# Altium integrated library Cells_in_Space.IntLib: 57 symbols (continued)
## CMP-2002-08143-1
designator R?, comment CRCW040210R0FKED
Manufacturer: Vishay Dale; Manufacturer: Vishay; Part Number: CRCW040210R0FKED; Manufacturer Part Number: CRCW040210R0FKED
footprint RESC1005X40X25NL05T05 (Chip Resistor, 2-Leads, Body 1.00x0.50mm, IPC Medium Density)
footprint RESC1005X40X25LL05T05 (Chip Resistor, 2-Leads, Body 1.00x0.50mm, IPC High Density)
footprint RESC1005X40X25ML05T05 (Chip Resistor, 2-Leads, Body 1.00x0.50mm, IPC Low Density)
pins: 1, 2
1 alternate drawing of the same symbol

## CMP-2002-08148-1
designator R?, comment CRCW0402110KFKED
Manufacturer: Vishay Dale; Manufacturer: Vishay; Part Number: CRCW0402110KFKED; Manufacturer Part Number: CRCW0402110KFKED
footprint RESC1005X40X25NL05T05 (Chip Resistor, 2-Leads, Body 1.00x0.50mm, IPC Medium Density)
footprint RESC1005X40X25ML05T05 (Chip Resistor, 2-Leads, Body 1.00x0.50mm, IPC Low Density)
footprint RESC1005X40X25LL05T05 (Chip Resistor, 2-Leads, Body 1.00x0.50mm, IPC High Density)
pins: 1, 2
1 alternate drawing of the same symbol

## CMP-2002-08276-2
designator R?, comment CRCW04021K00FKED
RES Thick Film, 1kΩ, 1%, 0.063W, 100ppm/°C, 0402; Manufacturer: Vishay Dale; Resistance: 1kR; Power Rating: 63mW; Voltage Rating (DC): 50V; Package Quantity: 10; Termination: SMD/SMT; Width: 0.5mm; Military Standard: Not; Length: 1mm; Contact Plating: Tin; Mount: Surface Mount; Packaging: Tape and Reel; Case Code (Imperial): 0402; Tolerance: 1%; Weight: 2.3E-05oz; Number of Pins: 2; Case/Package: 0402; Case Code (Metric): 1005; Lead Free: Lead Free; Number of Terminations: 2; Max Power Dissipation: 63mW; Depth: 0.5mm; Temperature Coefficient: 100ppm/°C; Max Operating Temperature: 155°C; Height: 0.35mm; Features: Automotive AEC-Q200; Composition: Thick Film; Radiation Hardening: No; Voltage Rating: 50V; Min Operating Temperature: -55°C; Manufacturer Part Number: CRCW04021K00FKED
footprint FP-CRCW0402-e3-MFG
footprint FP-CRCW0402-e3-IPC_C
footprint FP-CRCW0402-e3-IPC_B
footprint FP-CRCW0402-e3-IPC_A
pins: 1, 2

## CMP-2002-08403-1
designator R?, comment CRCW040224K0FKED
Manufacturer: Vishay Dale; Manufacturer: Vishay; Part Number: CRCW040224K0FKED; Manufacturer Part Number: CRCW040224K0FKED
footprint RESC1005X40X25ML05T05 (Chip Resistor, 2-Leads, Body 1.00x0.50mm, IPC Low Density)
footprint RESC1005X40X25LL05T05 (Chip Resistor, 2-Leads, Body 1.00x0.50mm, IPC High Density)
footprint RESC1005X40X25NL05T05 (Chip Resistor, 2-Leads, Body 1.00x0.50mm, IPC Medium Density)
pins: 1, 2
1 alternate drawing of the same symbol

## CMP-2002-08466-2
designator R?, comment CRCW04022K70FKED
RES Thick Film, 2.7kΩ, 1%, 0.063W, 100ppm/°C, 0402; Manufacturer: Vishay; Power Rating: 63mW; Voltage Rating (DC): 50V; Resistance: 2.7kR; Termination: SMD/SMT; Composition: Thick Film; Packaging: Tape and Reel; Tolerance: 1%; Number of Pins: 2; Contact Plating: Tin; Max Operating Temperature: 155°C; Depth: 0.5mm; Features: Automotive AEC-Q200; Lead Free: Lead Free; Number of Terminations: 2; Case/Package: 0402; Max Power Dissipation: 63mW; Radiation Hardening: No; Height: 0.35mm; Min Operating Temperature: -55°C; Width: 0.02inch; Military Standard: Not; Package Quantity: 10; Weight: 2.3E-05oz; Temperature Coefficient: 100ppm/°C; Case Code (Metric): 1005; Voltage Rating: 50V; Length: 1mm; Case Code (Imperial): 0402; Manufacturer Part Number: CRCW04022K70FKED
footprint FP-CRCW0402-e3-IPC_A
footprint FP-CRCW0402-e3-IPC_C
footprint FP-CRCW0402-e3-IPC_B
footprint FP-CRCW0402-e3-MFG
pins: 1, 2

## CMP-2002-08529-2
designator R?, comment CRCW040233K2FKED
NexarPartId: 39869749; Manufacturer: Vishay; Power Rating: 63mW; Temperature Coefficient: 100ppm/°C; Resistance: 33.2kΩ; Voltage Rating: 50V; Tolerance: 1%; REACH SVHC: Unknown; Number of Pins: 2; Military Standard: Not; Composition: Thick Film; Case Code (Imperial): 0402; Number of Terminations: 2; Lead Free: Lead Free; Case Code (Metric): 1005; Termination: SMD/SMT; Case/Package: 0402; Contact Plating: Tin; Height: 350µm; Min Operating Temperature: -55°C; Mount: Surface Mount; Max Operating Temperature: 155°C; Features: Automotive AEC-Q200; Length: 1mm; Weight: 652.039032µg; Packaging: Cut Tape; Schedule B: 8533210045, 8533210045; Voltage Rating (DC): 50V; Depth: 500µm; Max Power Dissipation: 63mW; RoHS: Compliant; Radiation Hardening: No; Width: 500µm; Manufacturer Part Number: CRCW040233K2FKED
footprint Vishay_CRCW0402-e3_MFG (SMD Chip Resistor, 33.2 kOhm, ± 1%, 63 mW, 0402 [1005 Metric], Thick Film, General Purpose)
footprint Vishay_CRCW0402-e3_IPC_A (SMD Chip Resistor, 33.2 kOhm, ± 1%, 63 mW, 0402 [1005 Metric], Thick Film, General Purpose)
footprint Vishay_CRCW0402-e3_IPC_B (SMD Chip Resistor, 33.2 kOhm, ± 1%, 63 mW, 0402 [1005 Metric], Thick Film, General Purpose)
footprint Vishay_CRCW0402-e3_IPC_C (SMD Chip Resistor, 33.2 kOhm, ± 1%, 63 mW, 0402 [1005 Metric], Thick Film, General Purpose)
pins: 1, 2

## CMP-2006-02363-4
designator C?, comment GCM188R71E105KA64D
Manufacturer Lifecycle Status: IN PRODUCTION; NexarPartId: 18909256; Manufacturer: Murata; Dielectric: X7R; Material: Ceramic; Tolerance: 10%; Capacitance: 1µF; Voltage Rating: 25V; Thickness: 889µm; Max Operating Temperature: 125°C; Radiation Hardening: No; Weight: 6.293594mg; Lead Free: Lead Free; Mount: Surface Mount; Case Code (Imperial): 0603; REACH SVHC: No SVHC; Lifecycle Status: Production; Depth: 800µm; Min Operating Temperature: -55°C; Height: 800µm; Case Code (Metric): 1608; Case/Package: 0603; Voltage: 25V; Packaging: Cut Tape; Length: 1.6mm; Termination: SMD/SMT; Width: 787.4µm; Voltage Rating (DC): 25V; RoHS: Compliant; Schedule B: 8532240020, 8532240020; Ratings: AEC-Q200; Manufacturer Part Number: GCM188R71E105KA64D
footprint FP-GCM188-0_1-MFG (Multilayer Ceramic Capacitor, 1 uF, 25 V, ± 10%, X7R, 0603 [1608 Metric])
footprint FP-GCM188-0_1-IPC_A (Multilayer Ceramic Capacitor, 1 uF, 25 V, ± 10%, X7R, 0603 [1608 Metric])
footprint FP-GCM188-0_1-IPC_B (Multilayer Ceramic Capacitor, 1 uF, 25 V, ± 10%, X7R, 0603 [1608 Metric])
footprint FP-GCM188-0_1-IPC_C (Multilayer Ceramic Capacitor, 1 uF, 25 V, ± 10%, X7R, 0603 [1608 Metric])
pins: 1, 2

## CMP-2008-03711-3
designator C?, comment GCM155R71C104KA55D
Ceramic Capacitor for Automotive 100nF ±10% 16VDC X7R 0402 Paper T/R; Manufacturer: Murata; Voltage Rating (DC): 16V; Termination: SMD/SMT; Length: 1mm; Voltage: 16V; Mount: Surface Mount; Packaging: Tape and Reel; Case Code (Metric): 1005; Case/Package: 0402; Voltage Rating: 16V; Min Operating Temperature: -55°C; Case Code (Imperial): 0402; Ratings: AEC-Q200; Height: 0.5mm; Tolerance: 10%; Width: 0.02inch; Radiation Hardening: No; Depth: 0.5mm; Capacitance: 100nF; Max Operating Temperature: 125°C; Package Quantity: 1; REACH SVHC: No SVHC; Thickness: 0.022inch; Dielectric: X7R; Lead Free: Lead Free; Manufacturer Part Number: GCM155R71C104KA55D
footprint FP-GCM155-0_05-IPC_C
footprint FP-GCM155-0_05-IPC_B
footprint FP-GCM155-0_05-IPC_A
footprint FP-GCM155-0_05-MFG
pins: 1, 2

## CMP-02407-012085-1
designator R?, comment CRCW040210K0FKEDC
RES 10K OHM 1% 1/16W 0402; Manufacturer: Vishay; Temperature Coefficient: 100ppm/°C; Power Rating: 62.5mW; Resistance: 10kR; Lead Free: Lead Free; Max Operating Temperature: 155°C; RoHS Compliant: Yes; Mount: Surface Mount; Min Operating Temperature: -55°C; Termination: Wraparound; Length: 1mm; Resistor Type: Thick Film; Contact Plating: Tin; Tolerance: 1%; Case/Package: Molded; Manufacturer Part Number: CRCW040210K0FKEDC
footprint FP-CRCW0402-C-e3-IPC_C
footprint FP-CRCW0402-C-e3-IPC_B
footprint FP-CRCW0402-C-e3-IPC_A
footprint FP-CRCW0402-C-e3-MFG
pins: 1, 2

## CMP-02550-000257-1
designator Q?, comment SQ2364EES-T1_GE3
MOSFET N-CH 60V 2A SOT23-3; Manufacturer: Vishay; Manufacturer Part Number: SQ2364EES-T1_GE3
footprint FP-S-03946-MFG
footprint FP-S-03946-IPC_B
footprint FP-S-03946-IPC_C
footprint FP-S-03946-IPC_A
pins: 1 G, 2 S, 3 D

## CMP-02766-001448-1
designator SWD?, comment FTSH-107-01-F-DV-K
CONN HEADER SMD 14POS 1.27MM; Manufacturer: Samtec; Gender: Male; Connector Type: Male Pin; Number of Contacts: 14; Row Spacing: 0.05inch; Min Operating Temperature: -55°C; Package Quantity: 1; Lead Free: Lead Free; RoHS Compliant: Yes; Contact Material: Bronze; Contact Plating: Gold; Number of Rows: 2; Housing Material: Polymer; Contact Type: Male Pin; Series: FTSH; Max Operating Temperature: 125°C; Orientation: Straight; Number of Positions: 14; Pitch: 1.27mm; Housing Color: Black; Color: Black; Radiation Hardening: No; Length: 8.89mm; Termination: Solder; Packaging: Rail/Tube; Depth: 5.84mm; Mount: Surface Mount; Contact Mating Length: 0.12inch; Manufacturer Part Number: FTSH-107-01-F-DV-K
footprint FP-FTSH-107-01-F-DV-K-MFG
part A pins: 1, 3, 5, 7, 9, 11, 13
part B pins: 2, 4, 6, 8, 10, 12, 14

## CMP-03020-034681-1
designator C?, comment C1206C102KGRACTU
CAP CER 1000PF 2KV X7R 1206; Manufacturer: KEMET; Tolerance: 10%; Capacitance: 1nF; Dissipation Factor: 2.5%; Dielectric Material: Ceramic; Voltage Rating (DC): 2.5kV; Voltage: 2kV; REACH SVHC: No SVHC; Height: 1.6mm; Construction: Flat; Case/Package: 1206; Series: C; Mount: Surface Mount; RoHS Compliant: Yes; Package Quantity: 1; Length: 3.2mm; Width: 0.063inch; Voltage Rating: 2kV; Min Operating Temperature: -55°C; Case Code (Metric): 3216; Termination: SMD/SMT; Number of Pins: 2; Case Code (Imperial): 1206; Packaging: Tape and Reel; Dielectric: X7R; Thickness: 0.069inch; Depth: 1.6mm; Radiation Hardening: No; Max Operating Temperature: 125°C; Manufacturer Part Number: C1206C102KGRACTU
footprint FP-C1206C-EF-MFG
footprint FP-C1206C-EF-IPC_C
footprint FP-C1206C-EF-IPC_B
footprint FP-C1206C-EF-IPC_A
pins: 1, 2

## CMP-03913-77814862-1
designator L?, comment 74404043330A
74404043330A WE-LQS SMT Semi-Shielded Power Inductor; NexarPartId: 77814862; Manufacturer: Wurth Electronics; Current Rating: 880mA; Inductance Tolerance: 20%; Inductance: 33µH; DC Resistance (DCR): 316mΩ; Ambient Temperature Range High: 85°C; Min Operating Temperature: -40°C; Length: 4mm; Height: 2.5mm; RoHS: Compliant; Ambient Temperature Range Low: -40°C; Width: 4mm; Max Operating Temperature: 125°C; Manufacturer Part Number: 74404043330A
footprint WE-LQS_4025 (WE-LQS SMT Semi-Shielded Power Inductor)
pins: 1, 2

## CMP-04918-000451-1
designator U?, comment LMR36015FSCQRNXTQ1
IC REG BUCK ADJ 1.5A 12VQFN; Manufacturer: Texas Instruments; RoHS Compliant: Yes; Manufacturer Part Number: LMR36015FSCQRNXTQ1
footprint FP-RNX0012B-MFG
pins: 1 PGND (power), 2 VIN (power), 3 NC, 4 BOOT, 5 VCC (power), 6 AGND (power), 7 FB (in), 8 PG (oc), 9 EN (in), 10 VIN (power), 11 PGND (power), 12 SW

## CMP-06035-006656-1
designator C?, comment GCM155R71H332KA37J
Ceramic Capacitor for Automotive 3.3nF ±10% 50VDC X7R 0402 Paper T/R; Manufacturer: Murata; Voltage Rating (DC): 50V; Max Operating Temperature: 125°C; Termination: SMD/SMT; Depth: 0.5mm; Min Operating Temperature: -55°C; Voltage Rating: 50V; Length: 1mm; Radiation Hardening: No; Tolerance: 10%; Case Code (Imperial): 0402; Mount: Surface Mount; Package Quantity: 50000; Width: 0.5mm; Height: 0.5mm; Case Code (Metric): 1005; Capacitance: 3.3nF; Packaging: Tape and Reel; Case/Package: 0402; Dielectric: X7R; Manufacturer Part Number: GCM155R71H332KA37J
footprint FP-GCM155-0_05-MFG
footprint FP-GCM155-0_05-IPC_B
footprint FP-GCM155-0_05-IPC_C
footprint FP-GCM155-0_05-IPC_A
pins: 1, 2

## CMP-06035-016531-1
designator C?, comment GCM155R71C224KE02D
Ceramic Capacitor for Automotive 220nF ±10% 16VDC X7R 0402 Paper T/R; Manufacturer: Murata; Voltage Rating (DC): 16V; Thickness: 0.022inch; Length: 0.039inch; Dielectric: X7R; Packaging: Tape and Reel; Min Operating Temperature: -55°C; Case Code (Imperial): 0402; Tolerance: 10%; Lead Free: Lead Free; Max Operating Temperature: 125°C; Case/Package: 0402; Mount: Surface Mount; Case Code (Metric): 1005; Weight: 0.000212oz; Height: 0.5mm; Voltage Rating: 16V; Ratings: AEC-Q200; Package Quantity: 10000; Capacitance: 220nF; Termination: SMD/SMT; Width: 0.5mm; Manufacturer Part Number: GCM155R71C224KE02D
footprint FP-GCM155-0_05-MFG
footprint FP-GCM155-0_05-IPC_C
footprint FP-GCM155-0_05-IPC_B
footprint FP-GCM155-0_05-IPC_A
pins: 1, 2

## CMP-06035-017415-1
designator C?, comment GRT188C81C106ME13D
Multi-Layer Ceramic Capacitor 10uF 16V X6S ±20% 0603 Paper T/R; Manufacturer: Murata; Capacitance: 10uF; Case Code (Imperial): 0603; Voltage Rating: 16V; Case/Package: 0603; Width: 0.031inch; Min Operating Temperature: -55°C; Tolerance: 20%; Case Code (Metric): 1608; Mount: Surface Mount; Packaging: Tape and Reel; Length: 0.063inch; Max Operating Temperature: 105°C; Thickness: 0.035inch; Ratings: AEC-Q200; Manufacturer Part Number: GRT188C81C106ME13D
footprint FP-GRT188-0_2-MFG
footprint FP-GRT188-0_2-IPC_C
footprint FP-GRT188-0_2-IPC_B
footprint FP-GRT188-0_2-IPC_A
pins: 1, 2

## CMP-06035-026512-1
designator C?, comment GCM21BC7YA225KE02L
Ceramic Capacitor for Automotive 2.2uF ±10% 35VDC X7S 0805 Embossed T/R; Manufacturer: Murata; Voltage Rating: 35V; Capacitance: 2.2uF; Case Code (Metric): 2012; Max Operating Temperature: 125°C; Min Operating Temperature: -55°C; Case Code (Imperial): 0805; Ratings: AEC-Q200; Packaging: Cut Tape; Mount: Surface Mount; Tolerance: 10%; Case/Package: 0805; Manufacturer Part Number: GCM21BC7YA225KE02L
footprint FP-GCM21B-0_15-MFG
footprint FP-GCM21B-0_15-IPC_B
footprint FP-GCM21B-0_15-IPC_C
footprint FP-GCM21B-0_15-IPC_A
pins: 1, 2

## CMP-06035-049372-1
designator C?, comment GCM21BC71E475KE36L
Ceramic Capacitor for Automotive 4.7uF ±10% 25VDC X7S 0805 Embossed T/R; Manufacturer: Murata; Voltage Rating: 25V; Mount: Surface Mount; Case/Package: 0805; Case Code (Imperial): 0805; Tolerance: 10%; Max Operating Temperature: 125°C; Capacitance: 4.7uF; Packaging: Cut Tape; Min Operating Temperature: -55°C; Ratings: AEC-Q200; Case Code (Metric): 2012; Manufacturer Part Number: GCM21BC71E475KE36L
footprint FP-GCM21B-0_2-e0_2_0_7-IPC_C
footprint FP-GCM21B-0_2-e0_2_0_7-MFG
footprint FP-GCM21B-0_2-e0_2_0_7-IPC_A
footprint FP-GCM21B-0_2-e0_2_0_7-IPC_B
pins: 1, 2

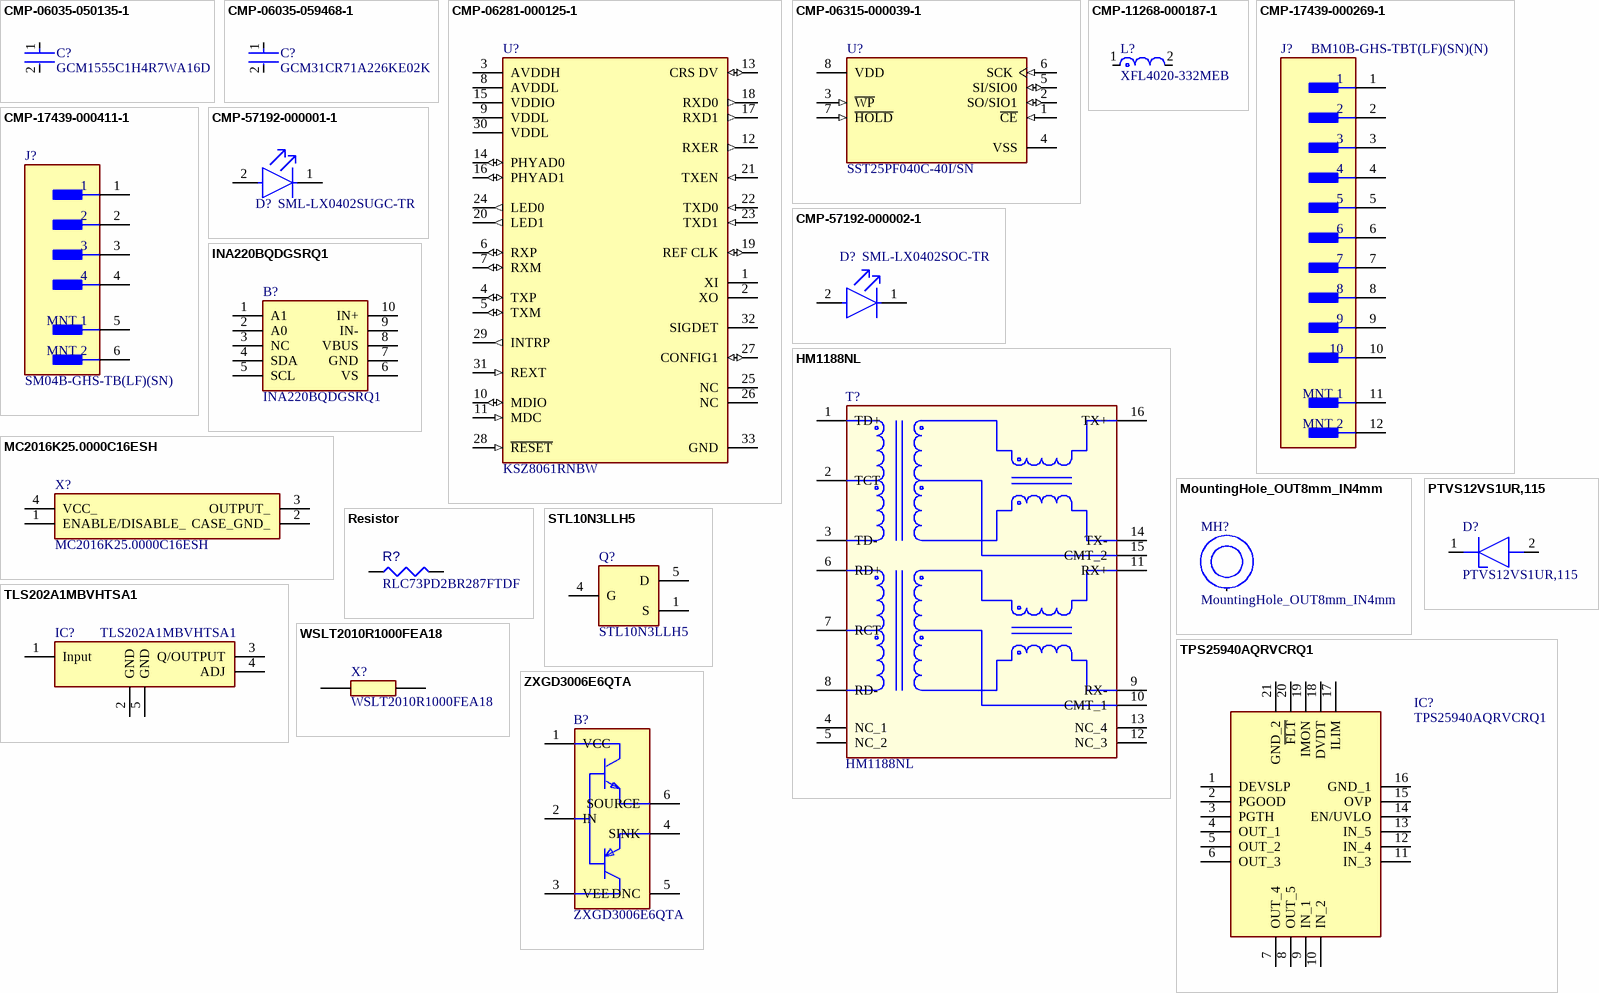
[diagram p1: symbols CMP-06035-050135-1 to ZXGD3006E6QTA]

## CMP-06035-050135-1
designator C?, comment GCM1555C1H4R7WA16D
Ceramic Capacitor for Automotive 4.7pF ±0.05pF 50VDC C0G 0402 Paper T/R; Manufacturer: Murata; Manufacturer Part Number: GCM1555C1H4R7WA16D
footprint FP-GCM155-0_05-MFG
footprint FP-GCM155-0_05-IPC_A
footprint FP-GCM155-0_05-IPC_B
footprint FP-GCM155-0_05-IPC_C
pins: 1, 2

## CMP-06035-059468-1
designator C?, comment GCM31CR71A226KE02K
Ceramic Capacitor for Automotive 22uF ±10% 10VDC X7R 1206 Embossed T/R; Manufacturer: Murata; Manufacturer Part Number: GCM31CR71A226KE02K
footprint FP-GCM31C-0_2-e0_3_0_8-IPC_A
footprint FP-GCM31C-0_2-e0_3_0_8-MFG
footprint FP-GCM31C-0_2-e0_3_0_8-IPC_C
footprint FP-GCM31C-0_2-e0_3_0_8-IPC_B
pins: 1, 2

## CMP-06281-000125-1
designator U?, comment KSZ8061RNBW
IC TRANSCEIVER FULL 1/1 32QFN; Manufacturer: Microchip; Data Rate: 100Mbps; Min Supply Voltage: 1.14V; Simplex/Duplex: Full Duplex; Max Supply Voltage: 3.465V; Packaging: Tray; Mount: Surface Mount; Case/Package: QFN; Max Operating Temperature: 105°C; Number of Pins: 32; Series: -; RoHS Compliant: No; REACH SVHC: No SVHC; Min Operating Temperature: -40°C; Manufacturer Part Number: KSZ8061RNBW
footprint FP-QFN55-32LD-PL-5-IPC_A
footprint FP-QFN55-32LD-PL-5-IPC_C
footprint FP-QFN55-32LD-PL-5-IPC_B
footprint FP-QFN55-32LD-PL-5-MFG
pins: 1 XI, 2 XO, 3 AVDDH (power), 4 TXP (io), 5 TXM (io), 6 RXP (io), 7 RXM (io), 8 AVDDL (power), 9 VDDL (power), 10 MDIO (io), 11 MDC (in), 12 RXER (out), 13 CRS DV (io), 14 PHYAD0 (io), 15 VDDIO (power), 16 PHYAD1 (io), 17 RXD1 (out), 18 RXD0 (out), 19 REF CLK (io), 20 LED1 (out), 21 TXEN (in), 22 TXD0 (in), 23 TXD1 (in), 24 LED0 (out), 25 NC, 26 NC, 27 CONFIG1 (io), 28 ~{RESET} (in), 29 INTRP (out), 30 VDDL (power), 31 REXT (in), 32 SIGDET, 33 GND (power)

## CMP-06315-000039-1
designator U?, comment SST25PF040C-40I/SN
IC FLASH 4MBIT SPI 40MHZ 8SOIC; Manufacturer: Microchip; Frequency: 40MHz; Min Operating Temperature: -40°C; Case/Package: SOIC; Max Operating Temperature: 85°C; Series: SST25; Packaging: Rail/Tube; Memory Type: FLASH; Interface: SPI; Manufacturer Part Number: SST25PF040C-40I/SN
footprint FP-C04-057-SN-IPC_B
footprint FP-C04-057-SN-IPC_A
footprint FP-C04-057-SN-IPC_C
footprint FP-C04-057-SN-MFG
pins: 1 ~{CE} (in), 2 SO/SIO1 (io), 3 ~{WP} (in), 4 VSS (power), 5 SI/SIO0 (io), 6 SCK (in), 7 ~{HOLD} (in), 8 VDD (power)

## CMP-11268-000187-1
designator L?, comment XFL4020-332MEB
Fixed Inductors 3.3Uh Shld 5.2A 38.3mOhms AECQ2; Manufacturer: Coilcraft; DC Resistance (DCR): 38.3mR; Shielding: Shielded; Inductance Tolerance: 20%; Saturation Current: 2.7A; Self Resonant Frequency: 33MHz; Test Frequency: 100kHz; Core Material: Composite; Series: XFL4020; Max Operating Temperature: 125°C; Mount: Surface Mount; Lead Free: Contains Lead; Height: 2.1mm; RMS Current (Irms): 5.2A; Termination: SMD/SMT; REACH SVHC: No SVHC; Tolerance: 20%; Package Quantity: 25; Length: 4.3mm; RoHS Compliant: Yes; Inductance: 3.3uH; Packaging: Tape and Reel; Case/Package: SMD/SMT; Width: 4.3mm; Max DC Current: 5.2A; Min Operating Temperature: -40°C; Manufacturer Part Number: XFL4020-332MEB
footprint FP-XFL4020-MFG
pins: 1, 2

## CMP-17439-000269-1
designator J?, comment BM10B-GHS-TBT(LF)(SN)(N)
CONN HEADER SMD 10POS 1.25MM; Manufacturer: JST; Mated Stacking Heights: 7.3mm; Number of Positions: 10; Voltage Rating: 50V; Packaging: Cut Tape; Contact Shape: Rectangular; Insulation Material: Nylon; Contact Type: Outer Shroud Contact; Contact Finish - Mating: TIN; Fastening Type: Ramp; Termination: Solder; Max Operating Temperature: 85°C; Min Operating Temperature: -25°C; Insulation Color: Natural; Number of Rows: 1; Flammability Rating: UL94 V-0; Contact Material: Bronze; Mount: Surface Mount; Series: GH; Connector Type: Header; Manufacturer Part Number: BM10B-GHS-TBT(LF)(SN)(N)
footprint FP-BM10B-GHS-TBT_LF_SN-MFG
pins: 1, 2, 3, 4, 5, 6, 7, 8, 9, 10, 11 MNT 1, 12 MNT 2

## CMP-17439-000411-1
designator J?, comment SM04B-GHS-TB(LF)(SN)
CONN HEADER SMD R/A 4POS 1.25MM; Manufacturer: JST; Voltage Rating: 50V; Number of Contacts: 4; Current Rating: 1A; Termination: Solder; Mount: Surface Mount; REACH SVHC: No SVHC; Packaging: Cut Tape; Contact Material: Bronze; Series: GH; Orientation: Right Angle; Lead Free: Lead Free; Housing Material: Nylon; Contact Plating: Tin; Housing Color: Natural; Number of Rows: 1; Pitch: 1.25mm; Number of Positions: 4; Manufacturer Part Number: SM04B-GHS-TB(LF)(SN)
footprint FP-SM04B-GHS-TB_LF_SN-MFG
pins: 1, 2, 3, 4, 5 MNT 1, 6 MNT 2

## CMP-57192-000001-1
designator D?, comment SML-LX0402SUGC-TR
LED GREEN CLEAR SMD; Manufacturer: Lumex; Forward Voltage: 2.2V; Test Current: 20mA; Luminous Intensity: 45mcd; Lens Style: Diffused; Number of LEDs: 1; Approvals: UL; Lens Color: Colorless; Dominant Wavelength: 574nm; Viewing Angle: 120°; Lead Free: Lead Free; Case/Package: 0402; Number of Pins: 2; Width: 0.5mm; Min Operating Temperature: -40°C; Case Code (Imperial): 0402; Packaging: Tape and Reel; Color: Green; Max Operating Temperature: 85°C; Case Code (Metric): 1005; Mount: Surface Mount; Length: 1mm; Wavelength: 574nm; Height: 0.5mm; Illumination Color: Green; Lens Transparency: Clear; Package Quantity: 1; Forward Current: 20mA; Manufacturer Part Number: SML-LX0402SUGC-TR
footprint FP-SML-LX0402SUGC-TR-MFG
pins: 1 C, 2 A

## CMP-57192-000002-1
designator D?, comment SML-LX0402SOC-TR
LED ORANGE CLEAR SMD; Manufacturer: Lumex; Forward Voltage: 2V; Viewing Angle: 120°; Luminous Intensity: 120mcd; Wavelength: 610nm; Forward Current: 20mA; Number of LEDs: 1; Lens Color: Colorless; Max Operating Temperature: 85°C; Mount: Surface Mount; Lens Transparency: Clear; Lens Style: Clear; Case Code (Metric): 1005; Length: 1mm; Package Quantity: 1; Case Code (Imperial): 0402; Color: Orange; Illumination Color: Orange; Width: 0.5mm; Packaging: Tape and Reel; Test Current: 20mA; Min Operating Temperature: -40°C; Height: 0.5mm; Number of Pins: 2; Lead Free: Lead Free; Case/Package: 0402; Manufacturer Part Number: SML-LX0402SOC-TR
footprint FP-SML-LX0402SOC-TR-MFG
pins: 1 C, 2 A

## HM1188NL
designator T?
Transformer; Manufacturer_Name: Pulse Electronics; Datasheet Link: https://componentsearchengine.com/Datasheets/1/HM1188NL.pdf; Height: 5.969mm; Manufacturer_Part_Number: HM1188NL; Mouser Part Number: 673-HM1188NL; Mouser Price/Stock: https://www.mouser.co.uk/ProductDetail/Pulse-Electronics/HM1188NL?qs=IbBl3rwNelMAAot5OPq3lA%3D%3D; Arrow Part Number: HM1188NL; Arrow Price/Stock: https://www.arrow.com/en/products/hm1188nl/pulse-electronics-corporation?region=nac
footprint HM1188NL
pins: 1 TD+, 2 TCT, 3 TD-, 4 NC_1, 5 NC_2, 6 RD+, 7 RCT, 8 RD-, 9 RX-, 10 CMT_1, 11 RX+, 12 NC_3, 13 NC_4, 14 TX-, 15 CMT_2, 16 TX+

## INA220BQDGSRQ1
designator B?
Automotive, 26-V, Bi-Directional, Zero-Drift, Low-/High-Side, I2C Out Current/Power Monitor; Manufacturer_Name: Texas Instruments; Geometry.Height: 1.1mm; Mouser Part Number: 595-INA220BQDGSRQ1; Mouser Price/Stock: https://www.mouser.co.uk/ProductDetail/Texas-Instruments/INA220BQDGSRQ1?qs=4whTb%2F0XQMgSmfUlXJGxRQ%3D%3D; Manufacturer_Part_Number: INA220BQDGSRQ1; Datasheet Link: http://www.ti.com/lit/gpn/ina220-q1
footprint SOP50P490X110-10N
pins: 1 A1, 2 A0, 3 NC, 4 SDA, 5 SCL, 6 VS, 7 GND, 8 VBUS, 9 IN-, 10 IN+

## MC2016K25.0000C16ESH
designator X?
XTAL OSC XO 25.0000MHZ CMOS SMD; Manufacturer_Name: KYOCERA; Geometry.Height: 0.8mm; Mouser Part Number: 581-MC2016K25.C16ESH; Mouser Price/Stock: https://www.mouser.co.uk/ProductDetail/KYOCERA-AVX/MC2016K25.0000C16ESH?qs=yTuLhIm%2Fv1ApwYpapkX4jg%3D%3D; Manufacturer_Part_Number: MC2016K25.0000C16ESH; Datasheet Link: https://media.digikey.com/pdf/Data%20Sheets/AVX%20PDFs/MC2016K25.0000C16ESH_Spec~.pdf
footprint MC2016K250000C16ESH
pins: 1 ENABLE/DISABLE_, 2 CASE_GND_, 3 OUTPUT_, 4 VCC_

## MountingHole_OUT8mm_IN4mm
designator MH?
footprint MountingHole_OUT8mm_IN4mm
pins: 1

## PTVS12VS1UR,115
designator D?
Diode ESD (Uni-directional); Manufacturer_Name: Nexperia; Datasheet Link: https://assets.nexperia.com/documents/data-sheet/PTVSXS1UR_SER.pdf; Manufacturer_Part_Number: PTVS12VS1UR,115; Mouser Part Number: 771-PTVS12VS1UR115; Mouser Price/Stock: https://www.mouser.co.uk/ProductDetail/Nexperia/PTVS12VS1UR115?qs=LMSg3oBIm%2FiWSHvsyxWiLg%3D%3D; Arrow Part Number: PTVS12VS1UR,115; Arrow Price/Stock: https://www.arrow.com/en/products/ptvs12vs1ur115/nexperia?region=nac
footprint SOD123W
pins: 1 K, 2 A

## Resistor
designator R?, comment value RLC73PD2BR287FTDF  (hidden comment: RES-2)
Resistor
footprint R0402 (Chip Resistor, 2-Leads, Body 1.05x0.55mm, IPC Medium Density)
footprint R0603 (Chip Resistor, 2-Leads, Body 1.65x0.95mm, IPC Medium Density)
footprint R0805 (Chip Resistor, 2-Leads, Body 2.2x1.35mm, IPC Medium Density)
footprint R1206 (Chip Resistor, 2-Leads, Body 3.25x1.65mm, IPC Medium Density)
pins: 1, 2
1 alternate drawing of the same symbol

## STL10N3LLH5
designator Q?
STMICROELECTRONICS - STL10N3LLH5 - MOSFET, N-CH, 30V, 9A, POWERFLAT; Geometry.Height: 1mm; Mouser Part Number: 511-STL10N3LLH5; Mouser Price/Stock: https://www.mouser.co.uk/ProductDetail/STMicroelectronics/STL10N3LLH5?qs=0gj%2FgiofzsOGxczN3DPYlA%3D%3D; Manufacturer_Name: STMicroelectronics; Manufacturer_Part_Number: STL10N3LLH5; Datasheet Link: https://www.st.com/resource/en/datasheet/stl10n3llh5.pdf
footprint STL10N3LLH5; pin to pad 1>1+2+3 5>5+6+7+8+9+10
pins: 1 S, 4 G, 5 D

## TLS202A1MBVHTSA1
designator IC?
Integrated Circuit; Manufacturer_Name: Infineon; Datasheet Link: https://www.infineon.com/dgdl/Infineon-TLS202A1MBV-DS-v01_00-EN.pdf?fileId=5546d46258fc0bc1015969d30cbf4211; Manufacturer_Part_Number: TLS202A1MBVHTSA1; Mouser Part Number: 726-TLS202A1MBVHTSA1; Mouser Price/Stock: https://www.mouser.co.uk/ProductDetail/Infineon-Technologies/TLS202A1MBVHTSA1?qs=0DP5yvOrqYl%252BugsjRWokhA%3D%3D
footprint TLS202A1MBVHTSA1
pins: 1 Input, 2 GND, 3 Q/OUTPUT, 4 ADJ, 5 GND

## TPS25940AQRVCRQ1
designator IC?
Integrated Circuit; Manufacturer_Name: Texas Instruments; Datasheet Link: http://www.ti.com/lit/gpn/tps25940-q1; Height: 0.8mm; Manufacturer_Part_Number: TPS25940AQRVCRQ1; Mouser Part Number: 595-TPS25940AQRVCRQ1; Mouser Price/Stock: https://www.mouser.co.uk/ProductDetail/Texas-Instruments/TPS25940AQRVCRQ1?qs=osPbIpHqQ9Uam0Tf4VM8lQ%3D%3D; Arrow Part Number: TPS25940AQRVCRQ1; Arrow Price/Stock: https://www.arrow.com/en/products/tps25940aqrvcrq1/texas-instruments
footprint QFN50P300X400X80-21N
pins: 1 DEVSLP, 2 PGOOD, 3 PGTH, 4 OUT_1, 5 OUT_2, 6 OUT_3, 7 OUT_4, 8 OUT_5, 9 IN_1, 10 IN_2, 11 IN_3, 12 IN_4, 13 IN_5, 14 EN/UVLO, 15 OVP, 16 GND_1, 17 ILIM, 18 DVDT, 19 IMON, 20 ~{FLT}, 21 GND_2

## WSLT2010R1000FEA18
designator X?
Current Sense Resistors - SMD 1watt .1ohms 1%; Manufacturer_Name: Vishay; Geometry.Height: 0.889mm; Mouser Part Number: 71-WSLT2010R1000FEA1; Mouser Price/Stock: https://www.mouser.co.uk/ProductDetail/Vishay-Dale/WSLT2010R1000FEA18?qs=g9ZB6v9yyDrIJygNjdpZKg%3D%3D; Manufacturer_Part_Number: WSLT2010R1000FEA18; Datasheet Link: https://componentsearchengine.com/Datasheets/2/WSLT2010R1000FEA18.pdf
footprint RESC5125X89N
pins: 1, 2

## ZXGD3006E6QTA
designator B?
Gate Drivers 10A Gate Driver 40V 9.5ns; Manufacturer_Name: Diodes Incorporated; Geometry.Height: 1.4mm; Mouser Part Number: 621-ZXGD3006E6QTA; Mouser Price/Stock: https://www.mouser.co.uk/ProductDetail/Diodes-Incorporated/ZXGD3006E6QTA?qs=%252Bk6%2F5FB6qrkSqHfjmaZYTQ%3D%3D; Manufacturer_Part_Number: ZXGD3006E6QTA; Datasheet Link: https://www.diodes.com/assets/Datasheets/ZXGD3006E6.pdf
footprint SOT95P285X140-6N
pins: 1 VCC, 2 IN, 3 VEE, 4 SINK, 5 DNC, 6 SOURCE